# Altium footprint library AmbiqAndromeda.PcbLib: 48 footprints (part 2 of 3)
Each footprint in its own frame and in the unit in brackets; x right, y up, seen from the top. Pads: shape width x height; smd on the part's side, far side on the other; paste and mask are expansions set on the pad; w line width, h text height; cw(c..) or ccw(c..) is an arc to the next point about the centre after c.
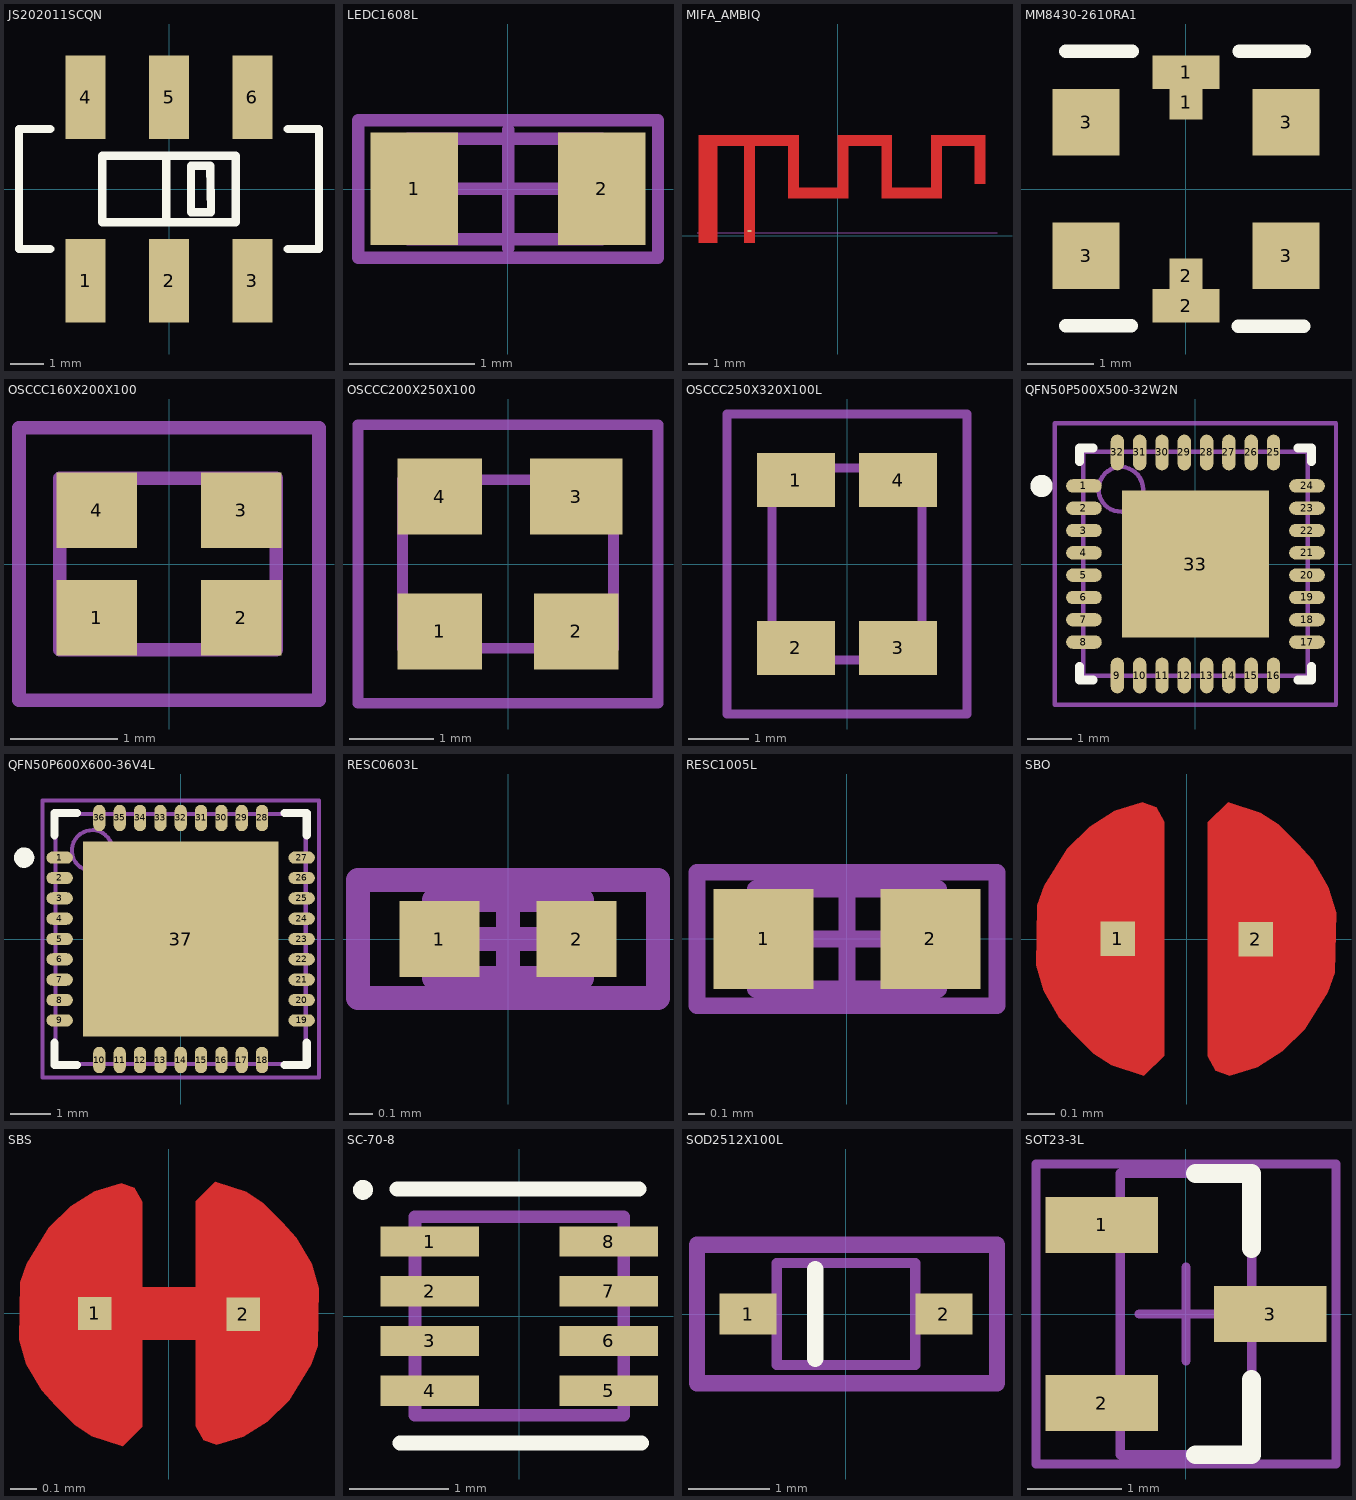
[diagram p1: the footprints below, top view; thin cyan lines are the x and y axes]

## JS202011SCQN [mm]
pads (6):
  rect 1.2x2.5 smd: 1(-2.5,-2.75) 2(0,-2.75) 3(2.5,-2.75) 4(-2.5,2.75) 5(0,2.75) 6(2.5,2.75)
Top Overlay:
  lines w0.254: -3.556,-1.8 -4.5,-1.8 -4.5,1.8 -3.556,1.8 ; -0.08,-1 -0.08,1 ; 3.556,-1.8 4.5,-1.8 4.5,1.8 3.556,1.8 ; -2,-1 -2,1 2,1 2,-1 -2,-1 ; 0.66,-0.7 0.66,0.7 1.24,0.7 1.26,-0.7 0.66,-0.7
3D body "JS.stp": height 3.6, standoff 0, extent -4.6,-3.5 4.6,3.5

## LEDC1608L [mm] "Chip LED, Body 1.6x0.8mm, IPC High Density"
height 0.6
pads (2):
  rect 0.7x0.9 smd: 1(-0.75,0) 2(0.75,0)
Mechanical 13:
  lines w0.1: -0.8,-0.401 -0.8,0.401 0.75,0.401 0.75,-0.401 0.261,-0.401 -0.261,-0.401 -0.8,-0.401
Mechanical 15:
  lines w0.1: -0.475,0 0.475,0 ; 0,-0.475 0,0.475 ; -1.2,-0.55 1.2,-0.55 1.2,0.55 -1.2,0.55 -1.2,-0.55
3D body "LED 0603玻璃罩.STEP": height 0.61, standoff 0.21, extent -0.599,-0.401 0.599,0.401
3D body "LED 0603-W.STEP": height 0.47, standoff 0, extent -0.8,-0.401 0.8,0.401

## MIFA_AMBIQ [mm]
pads (1):
  rect 0.2x0.1 smd mask+0.102: 1(-4.445,0.254)
Top Layer:
  region: -6.993,-0.354 -6.996,-0.354 -7,-0.352 -7.004,-0.348 -7.006,-0.343 -7.006,-0.341 -7.006,5.049 -7.006,5.052 -7.004,5.057 -7,5.06 -6.996,5.062 -6.993,5.062 -1.993,5.062 -1.99,5.062 -1.986,5.06 -1.982,5.057 -1.98,5.052 -1.98,5.049 -1.98,2.422 -0.006,2.422 -0.006,5.049 -0.006,5.052 -0.004,5.057 0,5.06 0.004,5.062 0.007,5.062 2.707,5.062 2.71,5.062 2.714,5.06 2.718,5.057 2.72,5.052 2.72,5.049 2.72,2.422 4.694,2.422 4.694,5.049 4.694,5.052 4.696,5.057 4.7,5.06 4.704,5.062 4.707,5.062 7.407,5.062 7.41,5.062 7.414,5.06 7.418,5.057 7.42,5.052 7.42,5.049 7.42,2.616 6.894,2.616 6.894,4.536 5.22,4.536 5.22,1.909 5.22,1.907 5.218,1.902 5.214,1.898 5.21,1.896 5.207,1.896 2.207,1.896 2.204,1.896 2.2,1.898 2.196,1.902 2.194,1.907 2.194,1.909 2.194,4.536 0.52,4.536 0.52,1.909 0.52,1.907 0.518,1.902 0.514,1.898 0.51,1.896 0.507,1.896 -2.493,1.896 -2.496,1.896 -2.5,1.898 -2.504,1.902 -2.506,1.907 -2.506,1.909 -2.506,4.536 -4.18,4.536 -4.18,-0.341 -4.18,-0.343 -4.182,-0.348 -4.186,-0.352 -4.19,-0.354 -4.193,-0.354 -4.693,-0.354 -4.696,-0.354 -4.7,-0.352 -4.704,-0.348 -4.706,-0.343 -4.706,-0.341 -4.706,4.536 -6.08,4.536 -6.08,-0.341 -6.08,-0.343 -6.082,-0.348 -6.086,-0.352 -6.09,-0.354 -6.093,-0.354
Mechanical 13:
  lines w0.025: -7.087,0.152 8.001,0.152

## MM8430-2610RA1 [mm]
height 0.71
pads (8):
  rect 0.5x0.52 smd: 1(0,1.3) 2(0,-1.3)
  rect 1x0.5 smd: 1(0,1.75) 2(0,-1.75)
  rect 1x1 smd: 3(-1.5,-1) 3(-1.5,1) 3(1.5,-1) 3(1.5,1)
Top Overlay:
  lines w0.2: -1.805,-2.05 -0.822,-2.05 ; -1.805,2.065 -0.805,2.065 ; 0.785,-2.06 1.768,-2.06 ; 0.795,2.065 1.778,2.065
3D body "User Library-MM8430-2610.STEP": height 1.75, standoff 0, extent -1.5,-1.5 1.5,1.5

## OSCCC160X200X100 [mm]
pads (4):
  rect 0.75x0.7 smd: 1(-0.675,-0.5) 2(0.675,-0.5) 3(0.675,0.5) 4(-0.675,0.5)
Mechanical 13:
  lines w0.127: -1.016,-0.8 -1.016,0.8 1,0.8 1,-0.8 -1.016,-0.8
Mechanical 15:
  lines w0.127: -1.397,-1.27 -1.397,0.381 -1.397,1.27 1.397,1.27 1.397,-1.27 -1.397,-1.27
3D body "User Library-NT2016SA-END4910A-48MHZ Crystal (NDK).STEP": height 0.7, standoff 0, extent -1,-0.8 1,0.8

## OSCCC200X250X100 [mm]
pads (4):
  rect 1x0.9 smd: 1(-0.81,-0.8) 2(0.81,-0.8) 4(-0.81,0.8)
  rect 1.1x0.9 smd: 3(0.81,0.8)
Mechanical 13:
  lines w0.127: -1.25,-1 1.25,-1 1.25,1 -1.25,1 -1.25,-1
Mechanical 15:
  lines w0.127: -1.778,-1.651 1.778,-1.651 1.778,1.651 -1.778,1.651 -1.778,0 -1.778,-1.524 -1.778,-1.651
3D body "User Library-SM2520-4.STEP": height 0.8, standoff -0.03, extent -1.25,-1 1.25,1

## OSCCC250X320X100L [mm]
height 0.71
pads (4):
  rect 1.3x0.9 smd: 1(-0.85,1.4) 2(-0.85,-1.4) 3(0.85,-1.4) 4(0.85,1.4)
Mechanical 13:
  lines w0.152: -1.25,-1.6 -1.25,1.6 1.25,1.6 1.25,-1.6 -1.25,-1.6
Mechanical 15:
  lines w0.152: -2,-2.5 -2,2.5 2,2.5 2,-2.5 -2,-2.5
3D body "User Library-User Library-Siward_SX3225.STEP": height 0.81, standoff 0, extent -1.25,-1.6 1.25,1.6

## QFN50P500X500-32W2N [mm] "QFN, 32-Leads, Body 5x5mm, Pitch 0.5mm, IPC Medium Density"
height 0.8
pads (33):
  oval 0.8x0.3 smd: 1(-2.5,1.75) 2(-2.5,1.25) 3(-2.5,0.75) 4(-2.5,0.25) 5(-2.5,-0.25) 6(-2.5,-0.75) 7(-2.5,-1.25) 8(-2.5,-1.75) 17(2.5,-1.75) 18(2.5,-1.25) 19(2.5,-0.75) 20(2.5,-0.25) 21(2.5,0.25) 22(2.5,0.75) 23(2.5,1.25) 24(2.5,1.75)
  oval 0.3x0.8 smd: 9(-1.75,-2.5) 10(-1.25,-2.5) 11(-0.75,-2.5) 12(-0.25,-2.5) 13(0.25,-2.5) 14(0.75,-2.5) 15(1.25,-2.5) 16(1.75,-2.5) 25(1.75,2.5) 26(1.25,2.5) 27(0.75,2.5) 28(0.25,2.5) 29(-0.25,2.5) 30(-0.75,2.5) 31(-1.25,2.5) 32(-1.75,2.5)
  rect 3.3x3.3 smd: 33(0,0)
Top Overlay:
  circle w0.25: c-3.45,1.75 r0.125
  lines w0.2: -2.6,-2.3 -2.6,-2.6 -2.3,-2.6 ; -2.6,2.3 -2.6,2.6 -2.3,2.6 ; 2.3,-2.6 2.6,-2.6 2.6,-2.3 ; 2.3,2.6 2.6,2.6 2.6,2.3
Mechanical 13:
  circle w0.1: c-1.675,1.675 r0.5
  lines w0.1: -2.515,-2.51 -2.515,2.515 2.515,2.515 2.515,-2.51 -2.515,-2.51
Mechanical 15:
  lines w0.1: -0.5,0 0.5,0 ; 0,-0.5 0,0.5 ; -3.15,-3.15 -3.15,3.15 3.15,3.15 3.15,-3.15 -3.15,-3.15
3D body "qfn32-5x5.step": height 0.8, standoff 0, extent -2.494,-2.51 2.526,2.51

## QFN50P600X600-36V4L [mm] "QFN, 36-Leads, Body 6x6mm, Pitch 0.5mm, IPC High Density"
height 1
pads (37):
  oval 0.65x0.3 smd: 1(-2.975,2) 2(-2.975,1.5) 3(-2.975,1) 4(-2.975,0.5) 5(-2.975,0) 6(-2.975,-0.5) 7(-2.975,-1) 8(-2.975,-1.5) 9(-2.975,-2) 19(2.975,-2) 20(2.975,-1.5) 21(2.975,-1) 22(2.975,-0.5) 23(2.975,0) 24(2.975,0.5) 25(2.975,1) 26(2.975,1.5) 27(2.975,2)
  oval 0.3x0.65 smd: 10(-2,-2.975) 11(-1.5,-2.975) 12(-1,-2.975) 13(-0.5,-2.975) 14(0,-2.975) 15(0.5,-2.975) 16(1,-2.975) 17(1.5,-2.975) 18(2,-2.975) 28(2,2.975) 29(1.5,2.975) 30(1,2.975) 31(0.5,2.975) 32(0,2.975) 33(-0.5,2.975) 34(-1,2.975) 35(-1.5,2.975) 36(-2,2.975)
  rect 4.8x4.8 smd: 37(0,0)
Top Overlay:
  circle w0.25: c-3.85,2 r0.125
  lines w0.2: -3.1,-2.55 -3.1,-3.1 -2.55,-3.1 ; -3.1,2.55 -3.1,3.1 -2.55,3.1 ; 2.55,-3.1 3.1,-3.1 3.1,-2.55 ; 2.55,3.1 3.1,3.1 3.1,2.55
Mechanical 13:
  circle w0.1: c-2.175,2.175 r0.5
  lines w0.1: -3.075,-3.075 3.075,-3.075 3.075,3.075 -3.075,3.075 -3.075,-3.075
Mechanical 15:
  lines w0.1: -0.5,0 0.5,0 ; 0,-0.5 0,0.5 ; -3.4,-3.4 3.4,-3.4 3.4,3.4 -3.4,3.4 -3.4,-3.4
3D body: height 1, standoff 0, extent -3.075,-3.075 3.075,3.075

## RESC0603L [mm] "Chip Resistor, Body 0.6x0.3mm, IPC High Density"
height 0.3
pads (2):
  rect 0.34x0.32 smd: 1(-0.29,0) 2(0.29,0)
Mechanical 13:
  lines w0.1: -0.315,-0.165 0.315,-0.165 0.315,0.165 -0.315,0.165 -0.315,-0.165
Mechanical 15:
  lines w0.1: -0.165,0 0.165,0 ; 0,-0.165 0,0.165 ; -0.635,-0.25 0.635,-0.25 0.635,0.25 -0.635,0.25 -0.635,-0.25
3D body "R 0201.STEP": height 0.23, standoff 0, extent -0.3,-0.15 0.3,0.15

## RESC1005L [mm] "Chip Resistor, Body 1.1x0.5mm, IPC High Density"
height 0.4
pads (2):
  rect 0.6x0.6 smd: 1(-0.5,0) 2(0.5,0)
Mechanical 13:
  lines w0.1: -0.55,-0.3 -0.55,0.3 0.55,0.3 0.55,-0.3 -0.55,-0.3
Mechanical 15:
  lines w0.1: -0.3,0 0.3,0 ; 0,-0.3 0,0.3 ; -0.9,-0.4 -0.9,0.4 0.9,0.4 0.9,-0.4 -0.9,-0.4
3D body "R 0402.STEP": height 0.3, standoff 0, extent -0.5,-0.25 0.5,0.25

## SBO [mil]
pads (2):
  rect 5x5 smd: 1(-10,0.04) 2(10,-0.04)
Top Layer:
  region: 3.05,16.93 6.03,19.82 10.69,18.31 13.23,16.62 16.13,13.72 18.23,11.42 20.53,7.52 21.63,3.82 21.43,-4.88 20.43,-7.68 17.13,-13.08 13.83,-16.28 10.22,-18.54 6.23,-19.78 4.23,-19.08 3.05,-17.01
  region: -3.24,-16.93 -6.22,-19.82 -10.88,-18.31 -13.42,-16.62 -16.32,-13.72 -18.42,-11.42 -20.72,-7.52 -21.82,-3.82 -21.62,4.88 -20.62,7.68 -17.32,13.08 -14.02,16.28 -10.41,18.54 -6.42,19.78 -4.42,19.08 -3.24,17.01
Top Solder:
  circle w24: c-0.1,0 r11

## SBS [mil]
pads (2):
  rect 5x5 smd: 1(-11.19,0) 2(11.19,-0.12)
Top Layer:
  region: -4.02,-17.09 -7,-19.98 -11.66,-18.46 -14.2,-16.78 -17.1,-13.88 -19.2,-11.58 -21.5,-7.68 -22.6,-3.98 -22.4,4.72 -21.4,7.52 -18.1,12.92 -14.8,16.12 -11.19,18.39 -7.2,19.62 -5.2,18.92 -4.02,16.85
  region: 4.02,16.93 7,19.82 11.66,18.31 14.2,16.62 17.1,13.72 19.2,11.42 21.5,7.52 22.6,3.82 22.4,-4.88 21.4,-7.68 18.1,-13.08 14.8,-16.28 11.19,-18.54 7.2,-19.78 5.2,-19.08 4.02,-17.01
  lines w8: -13.3,0 13.3,0
Top Solder:
  circle w24: c1.1,0 r11
  circle w24: c-1.1,0 r11

## SC-70-8 [mil]
height 27.95
pads (8):
  rect 39x12 smd: 1(-35.43,29.53) 2(-35.43,9.84) 3(-35.43,-9.84) 4(-35.43,-29.53) 5(35.43,-29.53) 6(35.43,-9.84) 7(35.43,9.84) 8(35.43,29.53)
Top Overlay:
  circle w3.94: c-61.97,50 r1.97
  lines w5.98: -48.38,50.32 47.36,50.32 ; -47.36,-50.32 48.38,-50.32
Mechanical 13:
  lines w5: -41.33,-39.36 -41.33,39.38 41.34,39.38 41.34,-39.36 -41.33,-39.36
3D body "User Library-SC 70-8.STEP": height 35.43, standoff -0.79, extent -41.34,-39.38 41.33,39.36

## SOD2512X100L [mm] "SOD Diode: SOD-323"
height 1
pads (2):
  rect 0.7x0.5 smd: 1(-1.2,0) 2(1.2,0)
Top Overlay:
  lines w0.2: -0.375,-0.55 -0.375,0.55
Mechanical 13:
  lines w0.127: -0.85,-0.625 -0.85,0.625 0.85,0.625 0.85,-0.625 -0.85,-0.625
Mechanical 15:
  lines w0.2: -1.825,-0.85 -1.825,0.85 1.85,0.85 1.85,-0.85 -1.825,-0.85
3D body "SOD-323.STEP": height 1, standoff 0.04, extent -1.311,-0.669 1.337,0.631

## SOT23-3L [mm] "SOT23, 3-Leads, Body 2.9x1.3mm, Pitch 0.95mm, Lead Span 2.5mm, IPC High Density"
height 1.1
pads (3):
  rect 1.2x0.6 smd: 1(-0.9,0.95) 2(-0.9,-0.95) 3(0.9,0)
Top Overlay:
  lines w0.2: 0.1,-1.5 0.7,-1.5 0.7,-0.7 ; 0.1,1.5 0.7,1.5 0.7,0.7
Mechanical 13:
  lines w0.1: -0.7,-1.5 -0.7,1.5 0.7,1.5 0.7,-1.5 -0.7,-1.5
Mechanical 15:
  lines w0.1: -0.5,0 0.5,0 ; 0,-0.5 0,0.5 ; -1.6,-1.6 -1.6,1.6 1.6,1.6 1.6,-1.6 -1.6,-1.6
3D body "SOT23.STEP": height 1.08, standoff 0, extent -1.295,-1.5 1.345,1.5